# Altium footprint library Package_SO.PcbLib: 333 footprints (part 12 of 21)
Each footprint in its own frame and in the unit in brackets; x right, y up, seen from the top. Pads: shape width x height; smd on the part's side, far side on the other; paste and mask are expansions set on the pad; w line width, h text height; cw(c..) or ccw(c..) is an arc to the next point about the centre after c.
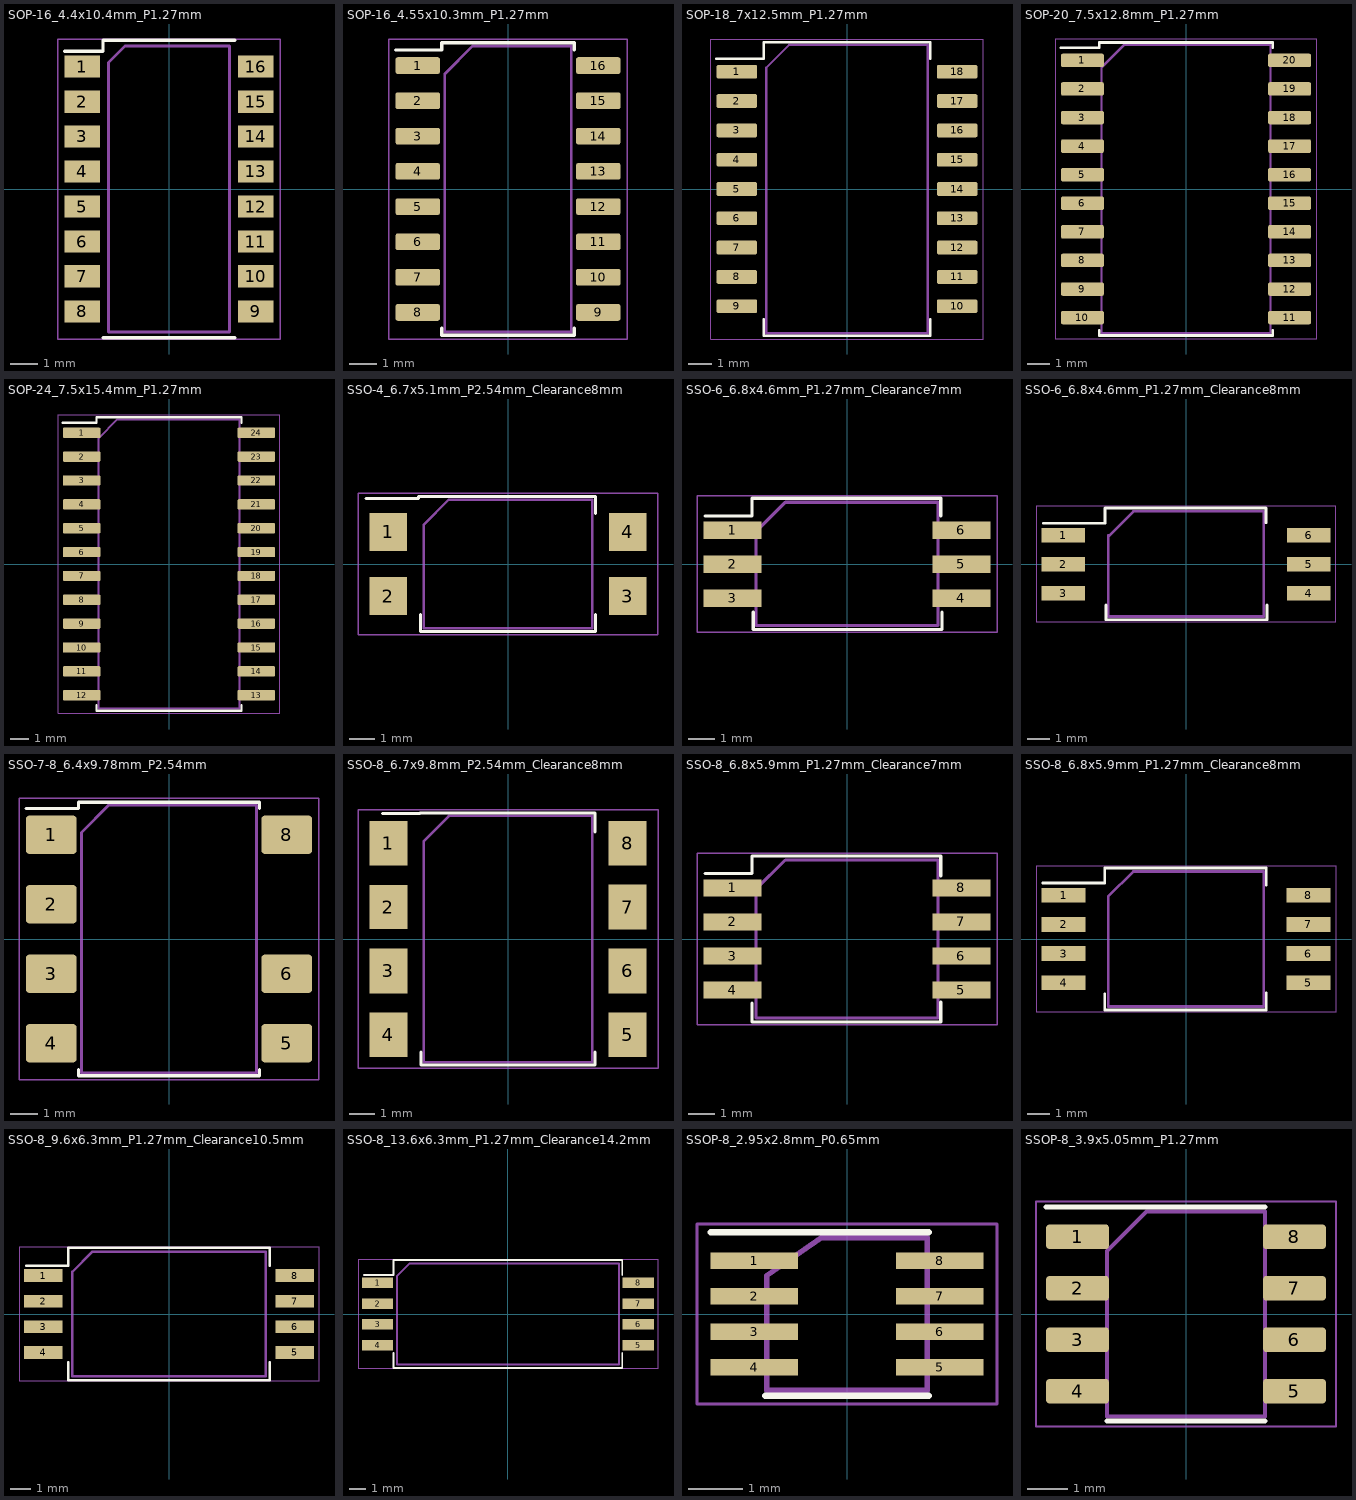
[diagram p11: the footprints below, top view; thin cyan lines are the x and y axes]

## SOP-16_4.4x10.4mm_P1.27mm [mm]
pads (16):
  rect 1.3x0.8 smd: 1(-3.15,4.45) 2(-3.15,3.17) 3(-3.15,1.91) 4(-3.15,0.64) 5(-3.15,-0.64) 6(-3.15,-1.91) 7(-3.15,-3.17) 8(-3.15,-4.45) 9(3.15,-4.45) 10(3.15,-3.17) 11(3.15,-1.91) 12(3.15,-0.64) 13(3.15,0.64) 14(3.15,1.91) 15(3.15,3.17) 16(3.15,4.45)
F.SilkS:
  lines w0.12: -3.8,5 -2.4,5 -2.4,5.4 2.4,5.4 ; -2.4,-5.4 2.4,-5.4
F.CrtYd:
  lines w0.05: -4.05,-5.45 4.05,-5.45 4.05,5.45 -4.05,5.45 -4.05,-5.45
F.Fab:
  lines w0.1: -2.2,-5.2 -2.2,4.6 -1.6,5.2 2.2,5.2 2.2,-5.2 -2.2,-5.2
  text "'.Designator'" at -3.117,-0.286 h0.8

## SOP-16_4.55x10.3mm_P1.27mm [mm]
pads (16):
  rrect25% 1.6x0.6 smd: 1(-3.25,4.445) 2(-3.25,3.175) 3(-3.25,1.905) 4(-3.25,0.635) 5(-3.25,-0.635) 6(-3.25,-1.905) 7(-3.25,-3.175) 8(-3.25,-4.445) 9(3.25,-4.445) 10(3.25,-3.175) 11(3.25,-1.905) 12(3.25,-0.635) 13(3.25,0.635) 14(3.25,1.905) 15(3.25,3.175) 16(3.25,4.445)
F.SilkS:
  lines w0.12: -4.05,5.005 -2.385,5.005 -2.385,5.26 0,5.26 2.385,5.26 2.385,5.005 ; -2.385,-5.005 -2.385,-5.26 0,-5.26 2.385,-5.26 2.385,-5.005
F.CrtYd:
  lines w0.05: -4.3,-5.4 -4.3,5.4 4.3,5.4 4.3,-5.4 -4.3,-5.4
F.Fab:
  lines w0.1: -2.275,-5.15 2.275,-5.15 2.275,5.15 -1.275,5.15 -2.275,4.15 -2.275,-5.15
  text "'.Designator'" at -3.897,-0.357 h1

## SOP-18_7x12.5mm_P1.27mm [mm]
pads (18):
  rrect25% 1.75x0.6 smd: 1(-4.775,5.08) 2(-4.775,3.81) 3(-4.775,2.54) 4(-4.775,1.27) 5(-4.775,0) 6(-4.775,-1.27) 7(-4.775,-2.54) 8(-4.775,-3.81) 9(-4.775,-5.08) 10(4.775,-5.08) 11(4.775,-3.81) 12(4.775,-2.54) 13(4.775,-1.27) 14(4.775,0) 15(4.775,1.27) 16(4.775,2.54) 17(4.775,3.81) 18(4.775,5.08)
F.SilkS:
  lines w0.12: -5.65,5.64 -3.61,5.64 -3.61,6.36 0,6.36 3.61,6.36 3.61,5.64 ; -3.61,-5.64 -3.61,-6.36 0,-6.36 3.61,-6.36 3.61,-5.64
F.CrtYd:
  lines w0.05: -5.9,-6.5 5.9,-6.5 5.9,6.5 -5.9,6.5 -5.9,-6.5
F.Fab:
  lines w0.1: -3.5,-6.25 3.5,-6.25 3.5,6.25 -2.5,6.25 -3.5,5.25 -3.5,-6.25
  text "'.Designator'" at -3.897,-0.357 h1

## SOP-20_7.5x12.8mm_P1.27mm [mm]
pads (20):
  rrect25% 1.9x0.6 smd: 1(-4.6,5.715) 2(-4.6,4.445) 3(-4.6,3.175) 4(-4.6,1.905) 5(-4.6,0.635) 6(-4.6,-0.635) 7(-4.6,-1.905) 8(-4.6,-3.175) 9(-4.6,-4.445) 10(-4.6,-5.715) 11(4.6,-5.715) 12(4.6,-4.445) 13(4.6,-3.175) 14(4.6,-1.905) 15(4.6,-0.635) 16(4.6,0.635) 17(4.6,1.905) 18(4.6,3.175) 19(4.6,4.445) 20(4.6,5.715)
F.SilkS:
  lines w0.12: -5.55,6.275 -3.86,6.275 -3.86,6.51 0,6.51 3.86,6.51 3.86,6.275 ; -3.86,-6.275 -3.86,-6.51 0,-6.51 3.86,-6.51 3.86,-6.275
F.CrtYd:
  lines w0.05: -5.8,-6.65 5.8,-6.65 5.8,6.65 -5.8,6.65 -5.8,-6.65
F.Fab:
  lines w0.1: -3.75,-6.4 -3.75,5.4 -2.75,6.4 3.75,6.4 3.75,-6.4 -3.75,-6.4
  text "'.Designator'" at -4.047,-0.84 h1

## SOP-24_7.5x15.4mm_P1.27mm [mm]
pads (24):
  rrect25% 2x0.55 smd: 1(-4.65,6.985) 2(-4.65,5.715) 3(-4.65,4.445) 4(-4.65,3.175) 5(-4.65,1.905) 6(-4.65,0.635) 7(-4.65,-0.635) 8(-4.65,-1.905) 9(-4.65,-3.175) 10(-4.65,-4.445) 11(-4.65,-5.715) 12(-4.65,-6.985) 13(4.65,-6.985) 14(4.65,-5.715) 15(4.65,-4.445) 16(4.65,-3.175) 17(4.65,-1.905) 18(4.65,-0.635) 19(4.65,0.635) 20(4.65,1.905) 21(4.65,3.175) 22(4.65,4.445) 23(4.65,5.715) 24(4.65,6.985)
F.SilkS:
  lines w0.12: -5.65,7.52 -3.86,7.52 -3.86,7.81 0,7.81 3.86,7.81 3.86,7.52 ; -3.86,-7.52 -3.86,-7.81 0,-7.81 3.86,-7.81 3.86,-7.52
F.CrtYd:
  lines w0.05: -5.9,-7.95 5.9,-7.95 5.9,7.95 -5.9,7.95 -5.9,-7.95
F.Fab:
  lines w0.1: -3.75,-7.7 -3.75,6.7 -2.75,7.7 3.75,7.7 3.75,-7.7 -3.75,-7.7
  text "'.Designator'" at -4.047,-0.84 h1

## SSO-4_6.7x5.1mm_P2.54mm_Clearance8mm [mm]
pads (4):
  rect 1.5x1.5 smd: 1(-4.75,1.27) 2(-4.75,-1.27) 3(4.75,-1.27) 4(4.75,1.27)
F.SilkS:
  lines w0.12: -5.64,2.6 -3.55,2.6 -3.55,2.67 3.47,2.67 3.47,2 ; -3.47,-2 -3.47,-2.67 3.47,-2.67 3.47,-2
F.CrtYd:
  lines w0.05: -5.95,-2.8 5.95,-2.8 5.95,2.8 -5.95,2.8 -5.95,-2.8
F.Fab:
  lines w0.1: -3.35,-2.55 3.35,-2.55 3.35,2.55 -2.35,2.55 -3.35,1.55 -3.35,-2.55
  text "'.Designator'" at -4.047,-0.84 h1

## SSO-6_6.8x4.6mm_P1.27mm_Clearance7mm [mm]
pads (6):
  rect 2.16x0.64 smd: 1(-4.27,1.27) 2(-4.27,0) 3(-4.27,-1.27) 4(4.27,-1.27) 5(4.27,0) 6(4.27,1.27)
F.SilkS:
  lines w0.12: -5.3,1.8 -3.55,1.8 ; -3.55,1.815 -3.55,2.465 3.5,2.465 3.5,1.815 ; -3.5,-1.785 -3.5,-2.435 3.55,-2.435 3.55,-1.785
F.CrtYd:
  lines w0.05: -5.6,-2.54 -5.6,2.56 5.6,2.56 5.6,-2.54 -5.6,-2.54
F.Fab:
  lines w0.12: -3.4,1.215 -2.3,2.315 3.4,2.315 3.4,-2.285 -3.4,-2.285 -3.4,1.265
  text "'.Designator'" at -4.047,-0.775 h1

## SSO-6_6.8x4.6mm_P1.27mm_Clearance8mm [mm]
pads (6):
  rect 1.9x0.64 smd: 1(-5.37,1.27) 2(-5.37,0) 3(-5.37,-1.27) 4(5.37,-1.27) 5(5.37,0) 6(5.37,1.27)
F.SilkS:
  lines w0.12: -6.25,1.8 -3.55,1.8 ; -3.55,1.815 -3.55,2.465 3.5,2.465 3.5,1.815 ; -3.5,-1.785 -3.5,-2.435 3.55,-2.435 3.55,-1.785
F.CrtYd:
  lines w0.05: -6.57,-2.54 -6.57,2.56 6.57,2.56 6.57,-2.54 -6.57,-2.54
F.Fab:
  lines w0.12: -3.4,1.215 -2.3,2.315 3.4,2.315 3.4,-2.285 -3.4,-2.285 -3.4,1.265
  text "'.Designator'" at -4.047,-0.775 h1

## SSO-7-8_6.4x9.78mm_P2.54mm [mm]
pads (7):
  rrect18% 1.85x1.4 smd: 1(-4.3,3.81) 2(-4.3,1.27) 3(-4.3,-1.27) 4(-4.3,-3.81) 5(4.3,-3.81) 6(4.3,-1.27) 8(4.3,3.81)
F.SilkS:
  lines w0.12: -5.225,4.77 -3.31,4.77 -3.31,5 0,5 3.31,5 3.31,4.77 ; -3.31,-4.77 -3.31,-5 0,-5 3.31,-5 3.31,-4.77
F.CrtYd:
  lines w0.05: -5.48,-5.14 5.48,-5.14 5.48,5.14 -5.48,5.14 -5.48,-5.14
F.Fab:
  lines w0.1: -3.2,-4.89 3.2,-4.89 3.2,4.89 -2.2,4.89 -3.2,3.89 -3.2,-4.89
  text "'.Designator'" at -4.047,-0.84 h1

## SSO-8_6.7x9.8mm_P2.54mm_Clearance8mm [mm]
pads (8):
  rect 1.52x1.78 smd: 1(-4.76,3.81) 3(-4.76,-1.27) 4(-4.76,-3.81) 5(4.76,-3.81) 6(4.76,-1.27) 7(4.76,1.27) 8(4.76,3.81)
  rect 1.52x1.75 smd: 2(-4.76,1.27)
F.SilkS:
  lines w0.12: -5,5 -3.5,5 -3.5,5.02 3.47,5.02 3.47,4.26 ; -3.47,-4.5 -3.47,-5.02 3.47,-5.02 3.47,-4.5
F.CrtYd:
  lines w0.05: -5.97,-5.15 -5.97,5.15 5.97,5.15 5.97,-5.15 -5.97,-5.15
F.Fab:
  lines w0.1: -3.35,-4.9 -3.35,3.9 -2.35,4.9 3.35,4.9 3.35,-4.9 -3.35,-4.9
  text "'.Designator'" at -4.047,-0.84 h1

## SSO-8_6.8x5.9mm_P1.27mm_Clearance7mm [mm]
pads (8):
  rect 2.16x0.64 smd: 1(-4.27,1.905) 2(-4.27,0.635) 3(-4.27,-0.635) 4(-4.27,-1.905) 5(4.27,-1.905) 6(4.27,-0.635) 7(4.27,0.635) 8(4.27,1.905)
F.SilkS:
  lines w0.12: -5.3,2.45 -3.55,2.45 -3.55,3.1 3.5,3.1 3.5,2.35 ; -3.55,-2.4 -3.55,-3.1 3.5,-3.1 3.5,-2.35
F.CrtYd:
  lines w0.05: -5.6,-3.2 5.6,-3.2 5.6,3.2 -5.6,3.2 -5.6,-3.2
F.Fab:
  lines w0.12: -3.4,-2.95 3.4,-2.95 3.4,2.95 -2.3,2.95 -3.4,1.85 -3.4,-2.95
  text "'.Designator'" at -4.047,-0.84 h1

## SSO-8_6.8x5.9mm_P1.27mm_Clearance8mm [mm]
pads (8):
  rect 1.905x0.64 smd: 1(-5.348,1.905) 2(-5.348,0.635) 3(-5.348,-0.635) 4(-5.348,-1.905) 5(5.348,-1.905) 6(5.348,-0.635) 7(5.348,0.635) 8(5.348,1.905)
F.SilkS:
  lines w0.12: -6.25,2.45 -3.55,2.45 -3.55,3.1 3.5,3.1 3.5,2.35 ; -3.55,-2.4 -3.55,-3.1 3.5,-3.1 3.5,-2.35
F.CrtYd:
  lines w0.05: -6.55,-3.2 -6.55,3.2 6.55,3.2 6.55,-3.2 -6.55,-3.2
F.Fab:
  lines w0.12: -3.4,-2.95 3.4,-2.95 3.4,2.95 -2.3,2.95 -3.4,1.85 -3.4,-2.95
  text "'.Designator'" at -4.047,-0.84 h1

## SSO-8_9.6x6.3mm_P1.27mm_Clearance10.5mm [mm]
pads (8):
  rect 1.905x0.64 smd: 1(-6.25,1.905) 2(-6.25,0.635) 3(-6.25,-0.635) 4(-6.25,-1.905) 5(6.25,-1.905) 6(6.25,-0.635) 7(6.25,0.635) 8(6.25,1.905)
F.SilkS:
  lines w0.12: -7.1,2.4 -5,2.4 -5,3.3 5,3.3 5,2.4 ; -5,-2.4 -5,-3.3 5,-3.3 5,-2.4
F.CrtYd:
  lines w0.05: -7.45,-3.35 -7.45,3.35 7.45,3.35 7.45,-3.35 -7.45,-3.35
F.Fab:
  lines w0.12: -4.8,-3.1 -4.8,2.1 -3.8,3.1 4.8,3.1 4.8,-3.1 -4.8,-3.1
  text "'.Designator'" at -4.047,-0.84 h1

## SSO-8_13.6x6.3mm_P1.27mm_Clearance14.2mm [mm]
pads (8):
  rect 1.905x0.64 smd: 1(-7.98,1.905) 2(-7.98,0.635) 3(-7.98,-0.635) 4(-7.98,-1.905) 5(7.98,-1.905) 6(7.98,-0.635) 7(7.98,0.635) 8(7.98,1.905)
F.SilkS:
  lines w0.12: -8.8,2.4 -7,2.4 -7,3.3 7,3.3 7,2.4 ; -7,-2.4 -7,-3.3 7,-3.3 7,-2.4
F.CrtYd:
  lines w0.05: -9.18,-3.35 -9.18,3.35 9.19,3.35 9.19,-3.35 -9.18,-3.35
F.Fab:
  lines w0.12: -6.8,-3.1 -6.8,2.3 -6,3.1 6.8,3.1 6.8,-3.1 -6.8,-3.1
  text "'.Designator'" at -4.047,-0.84 h1

## SSOP-8_2.95x2.8mm_P0.65mm [mm]
pads (8):
  rect 1.6x0.3 smd: 1(-1.7,0.975) 2(-1.7,0.325) 3(-1.7,-0.325) 4(-1.7,-0.975) 5(1.7,-0.975) 6(1.7,-0.325) 7(1.7,0.325) 8(1.7,0.975)
F.SilkS:
  lines w0.12: -2.5,1.5 1.5,1.5 ; -1.5,-1.5 1.5,-1.5
F.CrtYd:
  lines w0.05: -2.75,-1.65 2.75,-1.65 2.75,1.65 -2.75,1.65 -2.75,-1.65
F.Fab:
  lines w0.1: -1.475,-1.4 1.475,-1.4 1.475,1.4 -0.475,1.4 -1.475,0.7 -1.475,-1.4
  text "'.Designator'" at -2.488,-0.564 h0.6

## SSOP-8_3.9x5.05mm_P1.27mm [mm]
pads (8):
  rrect25% 1.55x0.6 smd: 1(-2.675,1.905) 2(-2.675,0.635) 3(-2.675,-0.635) 4(-2.675,-1.905) 5(2.675,-1.905) 6(2.675,-0.635) 7(2.675,0.635) 8(2.675,1.905)
F.SilkS:
  lines w0.12: -3.45,2.635 0,2.635 1.95,2.635 ; -1.95,-2.635 0,-2.635 1.95,-2.635
F.CrtYd:
  lines w0.05: -3.7,-2.78 -3.7,2.78 3.7,2.78 3.7,-2.78 -3.7,-2.78
F.Fab:
  lines w0.1: -1.95,-2.525 1.95,-2.525 1.95,2.525 -0.975,2.525 -1.95,1.55 -1.95,-2.525
  text "'.Designator'" at -3.969,-0.827 h0.98